# Altium integrated library Integrated_Library - 02.02.25 - 22.49.IntLib: 792 symbols (part 3 of 11) (continued)
## CMP-003-00013-2 (continued)
SMD Seam Sealing Crystal, 8 MHz, +/- 30 ppm, 18 pF, -10 to 70 degC, 4-Pin SMD, RoHS, Tape and Reel; Manufacturer: TXC; Frequency: 8MHz; Resistance: 100Ohm; Tolerance: 30ppm; Load Capacitance: 18pF; ESR: 100; Package Quantity: 1000; Datasheet URL: http://www.txccorp.com/download/products/quartz_crystals/2015TXC_7B_19.pdf; Case/Package: 7B-4; Packaging: TapeandReel; Frequency Tolerance: 30ppm; Min Operating Temperature: -20°C; RoHS Compliant: True; Package Reference: 7B-4; Mounting Technology: SM; Datasheet Version: Jul-15; Max Operating Temperature: 70°C; Package Description: 4-Pin Surface Mount Device, Body 5 x 3.2 mm, Pitch 3.7 mm; Pins: 4
footprint TXC-7B-4_V (SMD, 4-Leads, Body 5x3.2mm, Pitch 3.7mm)
pins: 1 X1, 2 GND (power), 3 X2, 4 GND (power)

## CMP-003-00014-2
designator Y?, comment 9HT10-32.768KDZF-T
Tuning Fork, 32.768 KHz, +/-20 ppm, 12.5 pF, -40 to 85 degC, 2-Pin SMD, RoHS, Tape and Reel; Manufacturer: TXC; Load Capacitance: 12.5pF; Tolerance: 20ppm; Resistance: 70000Ohm; ESR: 70k; Package Reference: 9HT10; Frequency: 32.768kHz; Package Description: 2-Pin Surface Mount Device, Body 3.2 x 1.5 mm; Case/Package: 9HT10; Max Operating Temperature: 85°C; RoHS Compliant: True; Frequency Tolerance: 20ppm; Package Quantity: 1; Datasheet URL: http://www.txccrystal.com/images/pdf/9ht10.pdf; Pins: 2; Datasheet Version: Jun-11; Mounting Technology: SM; Packaging: TapeandReel; Min Operating Temperature: -40°C
footprint TXC-9HT10_V (SMD, 2-Leads, Body 3.2x1.5mm)
pins: 1, 2

## CMP-003-00015-2
designator X?, comment ABM3B-12.000MHZ-B2-T
Ceramic SMD Crystal, 12 MHz, +/- 20 ppm, 18 pF, -20 to 70 degC, 4-Pin SMD, RoHS, Tape and Reel; Manufacturer: Abracon; ESR: 70; Load Capacitance: 18pF; Tolerance: 20ppm; Frequency: 12MHz; Resistance: 70Ohm; Mounting Technology: SM; Packaging: TapeandReel; Datasheet URL: http://www.abracon.com/Resonators/abm3b.pdf; Manufacturer URL: http://www.abracon.com/; RoHS Compliant: True; Frequency Tolerance: 20ppm; Datasheet Version: Aug-15; Max Operating Temperature: 70°C; Package Reference: ABM3B; Min Operating Temperature: -20°C; Pins: 4; Package Quantity: 1000; Package Description: 4-Pin Surface Mount Device, Body 5 x 3.2 mm; Case/Package: CSMD
footprint ABRA-ABM3B-4_V (SMD, 4-Leads, Body 5x3.2mm)
pins: 1 X1, 2 GND (power), 3 X2, 4 GND (power)

## CMP-003-00016-2
designator X?, comment ABM3B-12.288MHZ-B2-T
Ceramic SMD Crystal, 12.288 MHz, +/- 20 ppm, 18 pF, -20 to 70 degC, 4-Pin SMD, RoHS, Tape and Reel; Manufacturer: Abracon; Load Capacitance: 18pF; Frequency Tolerance: 20ppm; Resistance: 70Ohm; ESR: 70; Manufacturer URL: http://www.abracon.com/; Datasheet URL: http://www.abracon.com/Resonators/abm3b.pdf; Frequency: 12.288MHz; Min Operating Temperature: -20°C; RoHS Compliant: True; Case/Package: CSMD; Packaging: TapeandReel; Package Reference: ABM3B; Package Description: 4-Pin Surface Mount Device, Body 5 x 3.2 mm; Tolerance: 20ppm; Max Operating Temperature: 70°C; Datasheet Version: Aug-15; Mounting Technology: SM; Package Quantity: 1000; Pins: 4
footprint ABRA-ABM3B-4_V (SMD, 4-Leads, Body 5x3.2mm)
pins: 1 X1, 2 GND (power), 3 X2, 4 GND (power)

## CMP-003-00017-2
designator X?, comment ABM3B-16.000MHZ-B2-T
Ceramic SMD Crystal, 16 MHz, +/- 20 ppm, 18 pF, -20 to 70 degC, 4-Pin SMD, RoHS, Tape and Reel; Manufacturer: Abracon; Tolerance: 20ppm; Load Capacitance: 18pF; Frequency: 16MHz; Resistance: 50Ohm; ESR: 50; Max Operating Temperature: 70°C; Frequency Tolerance: 20ppm; Min Operating Temperature: -20°C; Packaging: TapeandReel; Manufacturer URL: http://www.abracon.com/; Package Quantity: 1000; Datasheet URL: http://www.abracon.com/Resonators/abm3b.pdf; Package Description: 4-Pin Surface Mount Device, Body 5 x 3.2 mm; Pins: 4; Package Reference: ABM3B; Datasheet Version: Aug-15; Case/Package: CSMD; Mounting Technology: SM; RoHS Compliant: True
footprint ABRA-ABM3B-4_V (SMD, 4-Leads, Body 5x3.2mm)
pins: 1 X1, 2 GND (power), 3 X2, 4 GND (power)

## CMP-003-00018-2
designator X?, comment ABM3B-20.000MHZ-B2-T
Ceramic SMD Crystal, 20 MHz, +/- 20 ppm, 18 pF, -20 to 70 degC, 4-Pin SMD, RoHS, Tape and Reel; Manufacturer: Abracon; Resistance: 50Ohm; ESR: 50; Tolerance: 20ppm; Frequency: 20MHz; Load Capacitance: 18pF; Package Description: 4-Pin Surface Mount Device, Body 5 x 3.2 mm; Package Quantity: 1; Case/Package: CSMD; Mounting Technology: SM; Packaging: TapeandReel; Pins: 4; Package Reference: ABM3B; Max Operating Temperature: 70°C; Datasheet Version: Aug-15; Min Operating Temperature: -20°C; Frequency Tolerance: 20ppm; Manufacturer URL: http://www.abracon.com/; Datasheet URL: http://www.abracon.com/Resonators/abm3b.pdf; RoHS Compliant: True
footprint ABRA-ABM3B-4_V (SMD, 4-Leads, Body 5x3.2mm)
pins: 1 X1, 2 GND (power), 3 X2, 4 GND (power)

## CMP-003-00019-2
designator X?, comment ABM3B-24.000MHZ-B2-T
Ceramic SMD Crystal, 24 MHz, +/- 20 ppm, 18 pF, -20 to 70 degC, 4-Pin SMD, RoHS, Tape and Reel; Manufacturer: Abracon; Load Capacitance: 18pF; Frequency Tolerance: 20ppm; ESR: 50; Resistance: 50Ohm; Frequency: 24MHz; Package Quantity: 1000; Packaging: TapeandReel; RoHS Compliant: True; Package Description: 4-Pin Surface Mount Device, Body 5 x 3.2 mm; Mounting Technology: SM; Pins: 4; Datasheet URL: http://www.abracon.com/Resonators/abm3b.pdf; Tolerance: 20ppm; Manufacturer URL: http://www.abracon.com/; Max Operating Temperature: 70°C; Datasheet Version: Aug-15; Min Operating Temperature: -20°C; Package Reference: ABM3B; Case/Package: CSMD
footprint ABRA-ABM3B-4_V (SMD, 4-Leads, Body 5x3.2mm)
pins: 1 X1, 2 GND (power), 3 X2, 4 GND (power)

## CMP-003-00020-2
designator X?, comment ABM3B-40.000MHZ-B2-T
Ceramic SMD Crystal, 40 MHz, +/- 20 ppm, 18 pF, -20 to 70 degC, 4-Pin SMD, RoHS, Tape and Reel; Manufacturer: Abracon; Frequency: 40MHz; Tolerance: 20ppm; Load Capacitance: 18pF; ESR: 50; Case/Package: CSMD; RoHS Compliant: True; Package Quantity: 1000; Manufacturer URL: http://www.abracon.com/; Mounting Technology: SM; Min Operating Temperature: -20°C; Datasheet Version: Aug-15; Package Reference: ABM3B; Package Description: 4-Pin Surface Mount Device, Body 5 x 3.2 mm; Max Operating Temperature: 70°C; Packaging: TapeandReel; Frequency Tolerance: 20ppm; Datasheet URL: http://www.abracon.com/Resonators/abm3b.pdf
footprint ABRA-ABM3B-4_V (SMD, 4-Leads, Body 5x3.2mm)
pins: 1 X1, 2 GND (power), 3 X2, 4 GND (power)

## CMP-003-00021-2
designator X?, comment ABM3B-8.000MHZ-B2-T
Ceramic SMD Crystal, 8 MHz, +/- 20 ppm, 18 pF, -20 to 70 degC, 4-Pin SMD, RoHS, Tape and Reel; Manufacturer: Abracon; Resistance: 200Ohm; ESR: 200; Tolerance: 20ppm; Frequency: 8MHz; Load Capacitance: 18pF; Mounting Technology: SM; Case/Package: CSMD; Pins: 4; Datasheet Version: Aug-15; Datasheet URL: http://www.abracon.com/Resonators/abm3b.pdf; Manufacturer URL: http://www.abracon.com/; Package Quantity: 1000; Package Description: 4-Pin Surface Mount Device, Body 5 x 3.2 mm; Package Reference: ABM3B; Min Operating Temperature: -20°C; Max Operating Temperature: 70°C; Packaging: TapeandReel; Frequency Tolerance: 20ppm; RoHS Compliant: True
footprint ABRA-ABM3B_V (SMD, 4-Leads, Body 5x3.2mm)
pins: 1 X1, 2 GND (power), 3 X2, 4 GND (power)

## CMP-003-00022-2
designator X?, comment ABS07-32.768KHz-T
Low Profile Crystal, 32.768 kHz, +/- 20 ppm, 12.5 pF, -40 to 85 degC, 2-Pin SMD, Pb-Free, Tape and Reel; Manufacturer: Abracon; Frequency Tolerance: 20ppm; ESR: 70k; Load Capacitance: 12.5pF; Max Operating Temperature: 85°C; Mounting Technology: SM; Manufacturer URL: http://www.abracon.com/; Pins: 2; Packaging: TapeandReel; Tolerance: 20ppm; Min Operating Temperature: -40°C; Frequency: 32.768kHz; Datasheet URL: http://www.abracon.com/Resonators/ABS07.pdf; RoHS Compliant: True; Package Description: 2-Pin Surface Mount Device, Body 3.2 x 1.5 mm; Datasheet Version: Aug-15; Package Reference: ABS07-2; Package URL: http://www.abracon.com/Support/PackageDrawing/Resonators/ABS07.PDF; Package Quantity: 3000; Case/Package: CSMD
footprint ABRA-ABS07-2_V (SMD, 2-Leads, Body 3.2x1.5mm)
pins: 1 OSC1, 2 OSC2

## CMP-003-00023-2
designator U?, comment CSTCE16M0V53-R0
Ceramic Resonator, 16 MHz, +/- 0.5%, 15 pF, -20 to 80 degC, 3-Pin SMD, RoHS, Tape and Reel; Manufacturer: Murata; Frequency: 16MHz; Impedance: 40Ohm; Load Capacitance: 15pF; Min Operating Temperature: -20°C; Case/Package: CSMD; Frequency Tolerance: 0.5%; Max Operating Temperature: 80°C; Datasheet URL: http://www.murata.com/products/catalog/pdf/p16e.pdf; Manufacturer URL: http://www.murata.com/; Self Resonant Frequency: 16MHz; Tolerance: 0.5%; Package Reference: CSTCE_V-3; Package Quantity: 3000; Packaging: TapeandReel; Pins: 3; Datasheet Version: Rev. P16E, 12/2015; RoHS Compliant: True
footprint MURA-CSTCE_V-3_V (SMD, 3-Leads, Body 3.2x1.3mm, Pitch 0.95mm)
pins: 1 C1, 2 GND (power), 3 C2

## CMP-003-00024-2
designator X?, comment FOXSDLF/160-20
Resistance Weld SMD Crystal, 16 MHz, +/- 30 ppm, 20 pF, -20 to 70 degC, 2-Pin SMD, RoHS, Tape and Reel; Manufacturer: FOX Electronics; Load Capacitance: 20pF; Frequency Tolerance: 30ppm; Tolerance: 50ppm; Resistance: 40Ohm; Frequency: 16MHz; ESR: 40; Packaging: TapeandReel; Mounting Technology: SM; Package Description: 2-Pin Surface Mount Device, Body 5 x 11.7 mm, Height 4.5 mm; Pins: 2; Datasheet URL: http://foxonline.com/pdfs/hc49sdlf.pdf; Max Operating Temperature: 70°C; Package Reference: FOX-FOXSDLF160-20; Datasheet Version: Mar-15; Package Quantity: 1; Manufacturer URL: http://www.foxonline.com/; Case/Package: FOX-FOXSDLF160-20; Min Operating Temperature: -20°C; RoHS Compliant: True
footprint FOX-FOXSDLF160-20_V (SMD, 2-Leads, Body 5x11.7mm, Height 4.5mm)
pins: 1 X1, 2 X2

## CMP-003-00025-2
designator Y?, comment FOXSLF/080-20
Resistance Weld Thru-Hole Crystal, 8 MHz, +/- 50 ppm, 10 pF, -20 to 70 degC, 2-Pin THD, RoHS, Bulk; Manufacturer: FOX Electronics; Load Capacitance: 20pF; Frequency Tolerance: 30ppm; Tolerance: 50ppm; ESR: 80; Resistance: 80Ohm; Frequency: 8MHz; Packaging: Bulk; Datasheet Version: Mar-15; Manufacturer URL: http://www.foxonline.com/; Package Reference: FOXSLF080-20; Max Operating Temperature: 70°C; Package Quantity: 100; RoHS Compliant: True; Pins: 2; Mounting Technology: TH; Package Description: 2-Pin Through Hole Device, Body 11.35 x 4.65 mm; Datasheet URL: http://download.siliconexpert.com/pdfs/2015/4/5/6/5/7/200/fox_/manual/35607121449963728hc49slf.pdf; Min Operating Temperature: -20°C; Case/Package: FOXSLF080-20
footprint FOX-FOXSLF080-20 (THD, 2-Leads, Body 11.35x4.65mm)
pins: 1, 2

## CMP-003-00026-2
designator Y?, comment FOXSLF/120-20
Resistance Weld Thru-Hole Crystal, 12 MHz, +/-30 ppm, 20 pF, -20 to 70 degC, 2-Pin THD, RoHS, Bulk; Manufacturer: FOX Electronics; ESR: 60; Resistance: 60Ohm; Frequency Tolerance: 30ppm; Load Capacitance: 20pF; Frequency: 12MHz; Tolerance: 50ppm; Max Operating Temperature: 70°C; Case/Package: FOXSLF-2; Datasheet Version: Mar-15; Mounting Technology: TH; Package Quantity: 100; Package Description: 2-Pin Through Hole Device, Body 11.35 x 4.65 mm, Pitch 4.88 mm; Packaging: Bulk; Package Reference: FOXSLF-2; RoHS Compliant: True; Pins: 2; Datasheet URL: http://www.foxonline.com/pdfs/hc49slf.pdf; Manufacturer URL: http://www.foxonline.com/; Min Operating Temperature: -20°C
footprint FOX-FOXSLF-2_V (THD, 2-Leads, Body 11.35x4.65mm, Pitch 4.88mm)
pins: 1, 2

## CMP-003-00027-2
designator Y?, comment FOXSLF/160-20
Resistance Weld Thru-Hole Crystal, 16 MHz, +/- 30 ppm, 20 pF, -20 to 70 degC, 2-Pin THD, RoHS, Bulk; Manufacturer: FOX Electronics; Load Capacitance: 20pF; Resistance: 40Ohm; ESR: 40; Tolerance: 50ppm; Frequency Tolerance: 30ppm; Frequency: 16MHz; Datasheet URL: http://www.foxonline.com/pdfs/hc49slf.pdf; Packaging: Bulk; Min Operating Temperature: -20°C; Max Operating Temperature: 70°C; Mounting Technology: TH; RoHS Compliant: True; Datasheet Version: Mar-15; Manufacturer URL: http://www.foxonline.com/; Package Description: 2-Pin Through Hole Device, Body 11.35 x 4.65 mm; Pins: 2; Package Quantity: 100; Case/Package: FOXSLF160-20; Package Reference: FOXSLF160-20
footprint FOX-FOXSLF160-20 (THD, 2-Leads, Body 11.35x4.65mm)
pins: 1, 2

## CMP-003-00028-3
designator X?, comment FA-12824.0000MF10Z-W3
Crystal, 24 MHz, +/- 10 ppm, -20 to 75 degC, 4-Pin SMD, RoHS, Tape and Reel; ESR: 80; Load Capacitance: 12pF; Frequency: 24MHz; Max Operating Temperature: 75°C; Pins: 4; RoHS Compliant: Yes; Min Operating Temperature: -20°C; Case/Package: SMD/SMT; Mounting Technology: SMT
footprint EPSON-FA-128_V (SMD, 4-Leads, Body 2x1.6mm, Pitch 1.45mm)
footprint EPSON-FA-128_V (SMD, 4-Leads, Body 2x1.6mm, Pitch 1.45mm)
pins: 1 X1, 2 NC (power), 3 X2, 4 NC (power)

## CMP-003-00029-1
designator Y?, comment ABS07-166-32.768KHZ-T
Crystal 32.768kHz 10ppm 7pF -40C +85C; Pins: 2; Frequency: 32.768kHz
footprint EPSON-FC-135_V (SMD, 2-Leads, Body 3.2x1.5mm)
footprint EPSON-FC-135_V-26 (SMD, 2-Leads, Body 3.2x1.5mm)
pins: 1, 2

## CMP-003-00030-2
designator X?, comment XTAL_SMD2016_32MHz_8pF_General
XTAL SMD 2016, 32MHz, Cl=8pF, Total Tol: ±40ppm; Pad Count: 4; Part Number: XTAL_SMD2016_32MHz_8pF_General; Value: 32MHz; Source: nrf52840_qiaa.SCHLIB; LatestRevisionDate: 2016-08-19; Published: 2016-08-19; Footprint Doc: XTAL_2016; Pins: 4; Design Item ID: XTAL_SMD2016_32MHz_8pF_General; Component Type: Standard
footprint BT-XTAL_2016
footprint BT-XTAL_2016
pins: 1 inp, 2 GND hidden to GND, 3 out, 4 GND hidden to GND

## CMP-003-00031-1
designator X?, comment XTAL_SMD3215_32.768kHz_9pF_General
XTAL SMD 3215, 32.768kHz, Cl=9pF, Total Tol: ±50ppm; Pad Count: 2; LatestRevisionDate: 2016-08-19; Published: 2016-08-19; Part Number: XTAL_SMD3215_32.768kHz_9pF_General; Source: nrf52840_qiaa.SCHLIB; Component Type: Standard; Footprint Doc: XTAL_3215; Design Item ID: XTAL_SMD3215_32.768kHz_9pF_General; Pins: 2; Value: 32.768kHz
footprint XTAL_3215
footprint XTAL_3215
pins: 1 inp, 2 out

## CMP-003-00035-2
designator X?, comment FA-128 32.0000MF20X-K5
32 MHz ±10ppm Crystal 10pF 60 Ohms 4-SMD, No Lead; ESR: 80; Load Capacitance: 12pF; Frequency: 24MHz; Crystal/Resonator Type: PARALLEL - FUNDAMENTAL; Min Operating Temperature: -20°C; Reach SVHC Compliant: Yes; Max Operating Temperature: 75°C; JESD-609 Code: e4; RoHS Compliant: Yes; Pins: 4; Mounting Technology: SMT; Case/Package: SMD/SMT
footprint EPSON-FA-128_V (SMD, 4-Leads, Body 2x1.6mm, Pitch 1.45mm)
footprint EPSON-FA-128_V (SMD, 4-Leads, Body 2x1.6mm, Pitch 1.45mm)
footprint BT-XTAL_2016
pins: 1 X1, 2 NC (power), 3 X2, 4 NC (power)

## CMP-004-00000-2
designator D?, comment 1N4148
High Speed Diode, 100 V, 0.45 A, -65 to 175 degC, 2-Pin SOD27, RoHS, Bulk; Manufacturer: Fairchild; Elements: 1; Recovery Time: 4ns; Forward Current: 300mA; Power: 500mW; Forward Voltage: 1V; Max Surge Current: 4A; Peak Reverse Current: 5uA; Datasheet URL: http://www.nxp.com/documents/data_sheet/1N4148_1N4448.pdf; Min Operating Temperature: -65°C; Manufacturer URL: https://www.fairchildsemi.com/; Packaging: Bulk; Diameter: 1.91mm; Pins: 2; Package URL: http://www.nxp.com/documents/data_sheet/1N4148_1N4448.pdf; Package Reference: SOD27; Max Operating Temperature: 175°C; Package Quantity: 2000; Case/Package: DO; Datasheet Version: Aug-04; RoHS Compliant: True
footprint NXP-SOD27-2_V (SOD27, 2-Leads, Dia 1.85mm, Body Length 4.25mm, Pin Spacing 9mm)
pins: 1 A, 2 K

## CMP-004-00001-2
designator D?, comment 1N4148WS
Small Signal Diode, 75 V, 0.15 A, -55 to 150 degC, 2-Pin SOD-323, RoHS, Tape and Reel; Manufacturer: Fairchild; Recovery Time: 4ns; Forward Voltage: 1V; Peak Reverse Current: 5uA; Forward Current: 150mA; Capacitance: -323f; Datasheet URL: https://www.fairchildsemi.com/datasheets/1N/1N4148WS.pdf; Package Reference: SOD-323; Package Description: 2-Pin Small Outline Diode Flat Lead, Body 1.7 x 1.25 mm; Case/Package: SOD-323; Mounting Technology: SM; Manufacturer URL: https://www.fairchildsemi.com/; Pins: 2; Packaging: TapeandReel; Package Quantity: 3000; Min Operating Temperature: -55°C; RoHS Compliant: True; Max Operating Temperature: 150°C; Datasheet Version: Rev. 1.2, 03/2015
footprint FAIR-SOD-323_V (SODFL, 2-Leads, Body 1.25x1.7mm)
pins: 1 A, 2 K

## CMP-004-00002-2
designator D?, comment 1N4148WS-7-F
Fast Switching Diode, 75 V, 0.3 A, -65 to 150 degC, 2-Pin SOD323, RoHS, Tape and Reel; Manufacturer: Diodes Inc; Peak Reverse Current: 1uA; Max Surge Current: 2A; Elements: 1; Forward Current: 300mA; Recovery Time: 4ns; Forward Voltage: 1.25V; Datasheet Version: Rev. 25-2, 03/2016; Case/Package: SOD; Min Operating Temperature: -65°C; RoHS Compliant: True; Max Operating Temperature: 150°C; Manufacturer URL: http://www.diodes.com/; Pins: 2; Package Quantity: 3000; Datasheet URL: http://www.diodes.com/datasheets/ds30097.pdf; Packaging: TapeandReel; Package Description: 2-Pin Small Outline Diode, Body 1.7 x 1.3 mm; Mounting Technology: SM; Package Reference: SOD323-2
footprint DIOD-SOD323-2-A_V (SOD-323, 2-Leads, Body 1.7x1.3mm, Lead Span 2.5mm)
pins: 1 A, 2 K

## CMP-004-00003-2
designator D?, comment MBR0520LT1G
Schottky Power Rectifier, 20 V, 5.5 A, -65 to 125 degC, 2-Pin SMD, RoHS, Tape and Reel; Manufacturer: ON Semiconductor; Forward Current: 500mA; Peak Reverse Current: 250uA; Elements: 1; Forward Voltage: 385mV; Max Surge Current: 5.5A; Max Operating Temperature: 125°C; Min Operating Temperature: -65°C; Mounting Technology: SM; Datasheet URL: http://www.onsemi.cn/pub_link/Collateral/MBR0520LT1-D.PDF; RoHS Compliant: True; Pins: 2; Package Quantity: 3000; Case/Package: SOD; Package Reference: SOD-123-2-425-04; Package Description: 2-Pin Surface Mount Device, Body 2.69 x 1.6 mm; Packaging: TapeandReel; Manufacturer URL: http://www.onsemi.com/; Datasheet Version: Rev. 6, 01/2012
footprint ONSC-SOD-123-2-425-04_V (SOD, 2-Leads, Body 2.69x1.6mm)
pins: 1 A, 2 K

## CMP-004-00004-2
designator D?, comment 1N4004
General Purpose Rectifier, 400 V, 1 A, -55 to 175 degC, 2-Pin DO-204AL (DO-41), RoHS, Tape and Reel; Manufacturer: Fairchild Semiconductor; Forward Voltage: 1.1V; Forward Current: 1A; Max Surge Current: 30A; Package Version: Rev. 2, 09/2008; Peak Reverse Current: 50A; Case/Package: DO-41-2; Pins: 2; RoHS Compliant: True; Diameter: 2.72mm; Package Reference: DO-41-2; Datasheet URL: https://www.fairchildsemi.com/datasheets/1N/1N4004.pdf; Manufacturer URL: https://www.fairchildsemi.com/; Max Operating Temperature: 175°C; Datasheet Version: Rev. 1.1.0, 11/2014; Package URL: http://www.fairchildsemi.com/dwg/DO/DO41A.pdf; Package Quantity: 5000; Min Operating Temperature: -55°C; Package Description: 2-Pin Axial Lead, Dia 2.375 mm, Body Length 4.63 mm; Mounting Technology: TH; Packaging: TapeandReel
footprint FAIR-DO-41-2 (THD, 2-Leads, Body 5.2x2.72mm, Pin Spacing 7.8mm)
pins: 1 A, 2 K

## CMP-004-00005-2
designator D?, comment B5819W
Schottky Barrier Rectifier, 40 V, 1 A, -65 to 125 degC, 2-Pin SOD123, RoHS, Tape and Reel; Manufacturer: Micro Commercial Components; Datasheet Version: Rev. B, 01/2013; RoHS Compliant: Unknown; Manufacturer URL: http://www.mccsemi.com/; Package URL: http://www.mccsemi.com/up_pdf/1N4448W(SOD-123).pdf; Case/Package: SOD123; Mounting Technology: SM; Datasheet URL: http://www.mccsemi.com/up_pdf/B5817W-B5819W(SOD-123).pdf; Package Description: 2-Pin Small Outline Diode, Body 2.7 x 1.6 mm, Height 1.35 mm; Package Reference: SOD123
footprint MCC-SOD123_V (SOD123, 2-Leads, Body 2.7x1.6mm, Height 1.35mm)
pins: 1 A, 2 K

## CMP-004-00006-2
designator D?, comment SS54B
Schottky Barrier Rectifier, 40 V, 5 A, -55 to 150 degC, 2-Pin SMD; Manufacturer: JCET; Datasheet URL: http://wiki.seeedstudio.com/images/3/3f/0310130P1.pdf; Datasheet Version: May-13; Package Reference: SMB-2; RoHS Compliant: Unknown; Manufacturer URL: http://www.cj-elec.com/; Mounting Technology: SM; Package Description: 2-Pin Surface Mount Device, Body 4.315 x 3.62 mm; Case/Package: SMB-2
footprint JCET-SMB-2_M (Molded Diode, 2-Leads, Body 4.57x3.94mm)
footprint JCET-SMB-2_L (Molded Diode, 2-Leads, Body 4.57x3.94mm)
footprint JCET-SMB-2_N (Molded Diode, 2-Leads, Body 4.57x3.94mm)
pins: 1 A, 2 K

## CMP-004-00007-2
designator D?, comment 1N4007
General Purpose Rectifier, 1.1 V, 1.0 A, -55 to 175 degC, 2-Pin DO-41, RoHS, Tape and Reel; Manufacturer: Fairchild; Peak Reverse Current: 5uA; Max Surge Current: 30A; Elements: 1; Forward Voltage: 1.1V; Package Version: Rev. 2, 09/2008; Forward Current: 1A; Package Quantity: 5000; Packaging: TapeandReel; Package URL: http://www.fairchildsemi.com/dwg/DO/DO41A.pdf; Manufacturer URL: https://www.fairchildsemi.com/; Package Reference: DO-41-2; Pins: 2; Min Operating Temperature: -55°C; Datasheet Version: Rev. 1.1.0, 11/2014; Max Operating Temperature: 175°C; RoHS Compliant: True; Case/Package: DO-41-2; Mounting Technology: TH; Package Description: 2-Pin Axial Lead, Dia 2.375 mm, Body Length 4.63 mm; Datasheet URL: https://www.fairchildsemi.com/datasheets/1N/1N4007.pdf
footprint FAIR-DO-41-2 (THD, 2-Leads, Body 5.2x2.72mm, Pin Spacing 7.8mm)
pins: 1 K, 2 A

## CMP-004-00008-2
designator D?, comment MBR360G
Axial Lead Rectifier, 60 V, 3 A, -65 to 150 degC, 2-Pin DO-201AD, RoHS, Bag; Manufacturer: ON Semiconductor; Forward Current: 3A; Forward Voltage: 1.08V; Peak Reverse Current: 600uA; Max Surge Current: 80A; Package URL: http://www.onsemi.com/pub_link/Collateral/267-05.PDF; Datasheet URL: http://www.onsemi.cn/pub_link/Collateral/MBR350-D.PDF; Package Description: 2-Pin Axial Lead, Dia 5.05 mm, Body Length 8.4 mm; Package Reference: AXIAL_LEAD-2-267-05; Diameter: 5.3mm; Datasheet Version: Rev. 6, 06/2006; Package Quantity: 500; Packaging: Bulk; Manufacturer URL: http://www.onsemi.com/; Pins: 2; Max Operating Temperature: 150°C; Min Operating Temperature: -65°C; Mounting Technology: TH; RoHS Compliant: True; Case/Package: AXIAL_LEAD-2-267-05
footprint ONSC-AXIAL_LEAD-2-267-05_V (AXIAL, 2-Leads, Diameter 5.05mm)
pins: 1 A, 2 K

## CMP-004-00009-2
designator D?, comment 1N5819
Low Drop Power Schottky Rectifier, 40 V, 1 A, 2-Pin DO-41, RoHS; Manufacturer: ON Semiconductor; Max Surge Current: 25A; Forward Current: 1A; Package Version: Rev. U, 02/2005; Peak Reverse Current: 1mA; Max Operating Temperature: 125°C; Case/Package: DO; Package URL: http://www.onsemi.cn/pub_link/Collateral/59-10.PDF; Packaging: Bulk; Manufacturer URL: http://www.onsemi.com/; Min Operating Temperature: -65°C; Package Description: 2-Pin, Axial Lead, Diameter 2.35 mm; Mounting Technology: TH; Datasheet URL: http://www.onsemi.cn/pub_link/Collateral/1N5817-D.PDF; Datasheet Version: Rev. 10, 07/2006; Package Reference: AXIAL_LEAD-2-59-10; Pins: 2; RoHS Compliant: True
footprint ONSC-AXIAL_LEAD-2-59-10_P (AXIAL, 2-Leads, Diameter 2.35mm)
pins: 1 A, 2 K

## CMP-004-00010-2
designator D?, comment BAS70-04,215
General-Purpose Schottky Diode, 70 V, 70 mA, -65 to 150 degC, 3-Pin SOT23, RoHS, Tape and Reel; Manufacturer: NXP; Max Surge Current: 100mA; Forward Current: 70mA; Peak Reverse Current: 10uA; Package Version: Feb-16; Forward Voltage: 1V; Packaging: TapeandReel; Mounting Technology: SM; Datasheet Version: Rev. 09, 01/2010; Datasheet URL: http://www.nxp.com/documents/data_sheet/BAS70_1PS7XSB70_SER.pdf; Package Quantity: 3000; Min Operating Temperature: -65°C; RoHS Compliant: True; Pins: 3; Package Reference: SOT23-3; Package Description: 3-Pin Small Outline Transistor, Body 1.3 x 2.9 mm, Pitch 0.95 mm; Case/Package: TO-236-3; Package URL: http://www.nxp.com/documents/outline_drawing/SOT23.pdf; Manufacturer URL: http://www.nxp.com/; Max Operating Temperature: 150°C
footprint NXP-SOT23-3_V (SOT23, 3-Leads, Body 2.9x1.3mm, Pitch 0.95mm)
pins: 1 A, 2 K, 3 C

## CMP-004-00011-2
designator D?, comment BAS70-04-7-F
Schottky Barrier Diode, 70 V, 70 mA, -55 to 125 degC, 3-Pin SOT23, RoHS, Tape and Reel; Manufacturer: Diodes Inc; Recovery Time: 5ns; Max Surge Current: 100mA; Forward Voltage: 1V; Forward Current: 70mA; Power: 200mW; Element Configuration: CommonCathode; Peak Reverse Current: 0.1uA; Elements: 2; Manufacturer URL: http://www.diodes.com/; Packaging: TapeandReel; Package Reference: SOT23-3; Mounting Technology: SM; Datasheet URL: http://www.diodes.com/_files/datasheets/ds11007.pdf; Max Operating Temperature: 125°C; Datasheet Version: Rev. 24-2, 08/2014; Min Operating Temperature: -55°C; Pins: 3; Case/Package: TO-236-3; Package Quantity: 3000; Package Description: 3-Pin Small Outline Transistor, Body 2.9 x 1.3 mm, Pitch 0.96 mm; RoHS Compliant: True
footprint DIOD-SOT23-3_V (SOT23, 3-Leads, Body 3x1.4mm, Pitch 0.95mm)
pins: 1 A, 2 K, 3 C

## CMP-004-00012-2
designator D?, comment BAS70-04-E3-08
Small Signal Schottky Diode, 70 V, 200 mA, -55 to 125 degC, 3-Pin SOT23, RoHS, Tape and Reel; Manufacturer: Vishay Semiconductor; Max Surge Current: 600mA; Forward Voltage: 1V; RoHS Compliant: True; Min Operating Temperature: -55°C; Datasheet Version: Rev. 2.0, 02/2013; Datasheet URL: http://www.vishay.com/docs/85702/bas70.pdf; Package Reference: SOT23-3; Package URL: http://www.vishay.com/docs/71196/71196.pdf; Manufacturer URL: http://www.vishay.com/; Pins: 3; Package Description: 3-Pin Small Outline Transistor, Body 2.95 x 1.315 mm, Pitch 0.95 mm; Max Operating Temperature: 125°C; Mounting Technology: SM; Packaging: TapeandReel; Package Quantity: 1; Case/Package: TO-236-3
footprint VISH-SOT23-3_V (SOT23, 3-Leads, Body 3.1x1.43mm, Pitch 0.95mm)
pins: 1 A, 2 K, 3 C

## CMP-004-00013-2
designator D?, comment BAT54S
Schottky Barrier Diode, 30 V, 0.2 A, -55 to 150 degC, 3-Pin SOT23, RoHS, Tape and Reel; Manufacturer: Fairchild; Recovery Time: 5ns; Package Version: Rev. 12, 03/2016; Forward Current: 200mA; Peak Reverse Current: 2uA; Elements: 2; Forward Voltage: 800mV; Max Surge Current: 600mA; Package Reference: SOT23-3; RoHS Compliant: True; Package URL: http://www.fairchildsemi.com/dwg/MA/MA03D.pdf; Pins: 3; Max Operating Temperature: 150°C; Package Quantity: 3000; Datasheet URL: https://www.fairchildsemi.com/datasheets/BA/BAT54S.pdf; Packaging: TapeandReel; Manufacturer URL: https://www.fairchildsemi.com/; Min Operating Temperature: -55°C; Datasheet Version: Rev. 2.3, 04/2016; Mounting Technology: SM; Package Description: 3-Pin Small Outline Transistor, Body 2.92 x 1.325 mm, Pitch 0.95 mm; Case/Package: SOT-23
footprint FAIR-SOT23-3_V (SOT23, 3-Leads, Body 3.12x1.5mm, Pitch 0.95mm)
pins: 1 A, 2 K, 3 C

## CMP-004-00014-2
designator D?, comment BAT54S,215
BAT54 Series Schottky Barrier Diode, 30 V, 200 mA, -55 to 150 degC, 3-Pin SOT23 (TO-236AB), RoHS, Tape and Reel; Manufacturer: NXP; Peak Reverse Current: 2uA; Elements: 2; Forward Current: 200mA; Forward Voltage: 800mV; Max Surge Current: 600mA; Recovery Time: 5ns; Package URL: http://www.nxp.com/documents/outline_drawing/SOT23.pdf; Pins: 3; Packaging: TapeandReel; Package Reference: SOT23; Datasheet URL: http://www.nxp.com/documents/data_sheet/BAT54_SER.pdf; Package Description: 3-Pin Small Outline Transistor, Body 2.9 x 1.3 mm, Pitch 0.95 mm; Manufacturer URL: http://www.nxp.com/; Case/Package: TO-236-3; Min Operating Temperature: -55°C; Max Operating Temperature: 150°C; Mounting Technology: SM; RoHS Compliant: True; Datasheet Version: Rev. 5, 10/2012; Package Quantity: 3000
footprint NXP-SOT23_N (SOT23, 3-Leads, Body 3x1.4mm, Pitch 0.95mm, IPC Medium Density)
footprint NXP-SOT23_L (SOT23, 3-Leads, Body 3x1.4mm, Pitch 0.95mm, IPC High Density)
footprint NXP-SOT23_M (SOT23, 3-Leads, Body 3x1.4mm, Pitch 0.95mm, IPC Low Density)
pins: 1 A, 2 K, 3 C
